# Altium footprint library WR-TBL_Pluggable PCB Header.PcbLib: 719 footprints (part 15 of 45)
Each footprint in its own frame and in the unit in brackets; x right, y up, seen from the top. Pads: shape width x height; smd on the part's side, far side on the other; paste and mask are expansions set on the pad; w line width, h text height; cw(c..) or ccw(c..) is an arc to the next point about the centre after c.
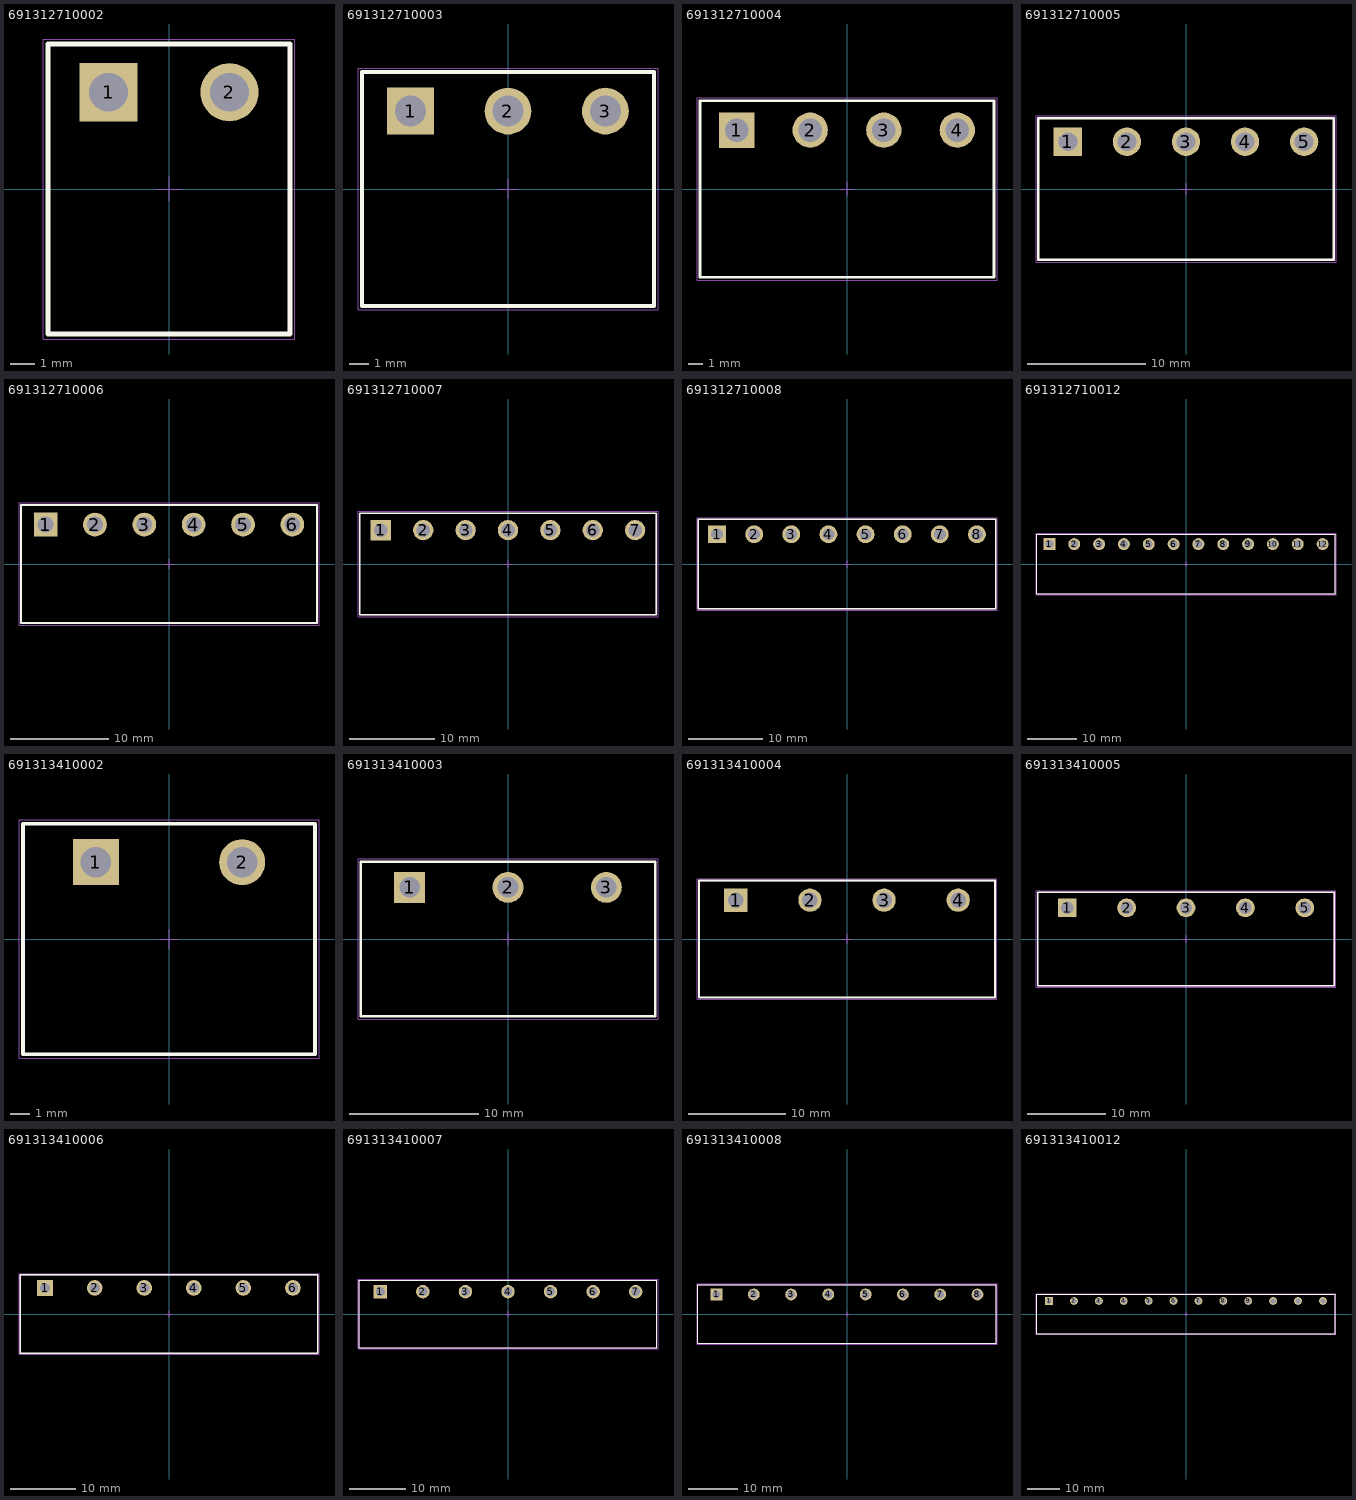
[diagram p14: the footprints below, top view; thin cyan lines are the x and y axes]

## 691312710002 [mm] "5.00mm - Open Horizhontal PCB Header - 02p"
height 8.5
pads (2):
  rect 2.4x2.4 hole 1.6: 1(-2.5,4)
  round 2.4 hole 1.6: 2(2.5,4)
Top Overlay:
  lines w0.2: -5,-6 -5,6 5,6 5,-6 -5,-6
Mechanical 13:
  lines w0.1: -5,-6 5,-6 5,6 -5,6 -5,-6
Mechanical 15:
  lines w0.05: -0.5,0 0.5,0 ; 0,-0.5 0,0.5 ; -5.2,-6.2 -5.2,6.2 5.2,6.2 5.2,-6.2 -5.2,-6.2
3D body "691312710002.stp": height 8.55, standoff -3.45, extent -5,-6 5,6

## 691312710003 [mm] "5.00mm - Open Horizhontal PCB Header - 03p"
height 8.5
pads (3):
  rect 2.4x2.4 hole 1.6: 1(-5,4)
  round 2.4 hole 1.6: 2(0,4) 3(5,4)
Top Overlay:
  lines w0.2: -7.5,-6 7.5,-6 7.5,6 -7.5,6 -7.5,-6
Mechanical 13:
  lines w0.1: -7.5,-6 -7.5,6 7.5,6 7.5,-6 -7.5,-6
Mechanical 15:
  lines w0.05: -0.5,0 0.5,0 ; 0,-0.5 0,0.5 ; -7.7,-6.2 7.7,-6.2 7.7,6.2 -7.7,6.2 -7.7,-6.2
3D body "691312710003.stp": height 8.55, standoff -3.45, extent -7.5,-6 7.5,6

## 691312710004 [mm] "5.00mm - Open Horizhontal PCB Header - 04p"
height 8.5
pads (4):
  rect 2.4x2.4 hole 1.6: 1(-7.5,4)
  round 2.4 hole 1.6: 2(-2.5,4) 3(2.5,4) 4(7.5,4)
Top Overlay:
  lines w0.2: -10,-6 10,-6 10,6 -10,6 -10,-6
Mechanical 13:
  lines w0.1: -10,-6 -10,6 10,6 10,-6 -10,-6
Mechanical 15:
  lines w0.05: -0.5,0 0.5,0 ; 0,-0.5 0,0.5 ; -10.2,-6.2 10.2,-6.2 10.2,6.2 -10.2,6.2 -10.2,-6.2
3D body "691312710004.stp": height 8.55, standoff -3.45, extent -10,-6 10,6

## 691312710005 [mm] "5.00mm - Open Horizhontal PCB Header - 05p"
height 8.5
pads (5):
  rect 2.4x2.4 hole 1.6: 1(-10,4)
  round 2.4 hole 1.6: 2(-5,4) 3(0,4) 4(5,4) 5(10,4)
Top Overlay:
  lines w0.2: -12.5,-6 12.5,-6 12.5,6 -12.5,6 -12.5,-6
Mechanical 13:
  lines w0.1: -12.5,-6 -12.5,6 12.5,6 12.5,-6 -12.5,-6
Mechanical 15:
  lines w0.05: -0.5,0 0.5,0 ; 0,-0.5 0,0.5 ; -12.7,-6.2 12.7,-6.2 12.7,6.2 -12.7,6.2 -12.7,-6.2
3D body "691312710005.stp": height 8.55, standoff -3.45, extent -12.5,-6 12.5,6

## 691312710006 [mm] "5.00mm - Open Horizhontal PCB Header - 06p"
height 8.5
pads (6):
  rect 2.4x2.4 hole 1.6: 1(-12.5,4)
  round 2.4 hole 1.6: 2(-7.5,4) 3(-2.5,4) 4(2.5,4) 5(7.5,4) 6(12.5,4)
Top Overlay:
  lines w0.2: -15,-6 -15,6 15,6 15,-6 -15,-6
Mechanical 13:
  lines w0.1: -15,-6 15,-6 15,6 -15,6 -15,-6
Mechanical 15:
  lines w0.05: -0.5,0 0.5,0 ; 0,-0.5 0,0.5 ; -15.2,-6.2 -15.2,6.2 15.2,6.2 15.2,-6.2 -15.2,-6.2
3D body "691312710006.stp": height 8.55, standoff -3.45, extent -15,-6 15,6

## 691312710007 [mm] "5.00mm - Open Horizhontal PCB Header - 07p"
height 8.5
pads (7):
  rect 2.4x2.4 hole 1.6: 1(-15,4)
  round 2.4 hole 1.6: 2(-10,4) 3(-5,4) 4(0,4) 5(5,4) 6(10,4) 7(15,4)
Top Overlay:
  lines w0.2: -17.5,-6 -17.5,6 17.5,6 17.5,-6 -17.5,-6
Mechanical 13:
  lines w0.1: -17.5,-6 17.5,-6 17.5,6 -17.5,6 -17.5,-6
Mechanical 15:
  lines w0.05: -0.5,0 0.5,0 ; 0,-0.5 0,0.5 ; -17.7,-6.2 -17.7,6.2 17.7,6.2 17.7,-6.2 -17.7,-6.2
3D body "691312710007.stp": height 8.55, standoff -3.45, extent -17.5,-6 17.5,6

## 691312710008 [mm] "5.00mm - Open Horizhontal PCB Header - 08p"
height 8.5
pads (8):
  rect 2.4x2.4 hole 1.6: 1(-17.5,4)
  round 2.4 hole 1.6: 2(-12.5,4) 3(-7.5,4) 4(-2.5,4) 5(2.5,4) 6(7.5,4) 7(12.5,4) 8(17.5,4)
Top Overlay:
  lines w0.2: -20,-6 -20,6 20,6 20,-6 -20,-6
Mechanical 13:
  lines w0.1: -20,-6 20,-6 20,6 -20,6 -20,-6
Mechanical 15:
  lines w0.05: -0.5,0 0.5,0 ; 0,-0.5 0,0.5 ; -20.2,-6.2 -20.2,6.2 20.2,6.2 20.2,-6.2 -20.2,-6.2
3D body "691312710008.stp": height 8.55, standoff -3.45, extent -20,-6 20,6

## 691312710012 [mm] "5.00mm - Open Horizhontal PCB Header - 12p"
height 8.5
pads (12):
  rect 2.4x2.4 hole 1.6: 1(-27.5,4)
  round 2.4 hole 1.6: 2(-22.5,4) 3(-17.5,4) 4(-12.5,4) 5(-7.5,4) 6(-2.5,4) 7(2.5,4) 8(7.5,4) 9(12.5,4) 10(17.5,4) 11(22.5,4) 12(27.5,4)
Top Overlay:
  lines w0.2: -30,-6 30,-6 30,6 -30,6 -30,-6
Mechanical 13:
  lines w0.1: -30,-6 -30,6 30,6 30,-6 -30,-6
Mechanical 15:
  lines w0.05: -0.5,0 0.5,0 ; 0,-0.5 0,0.5 ; -30.2,-6.2 30.2,-6.2 30.2,6.2 -30.2,6.2 -30.2,-6.2
3D body "691312710012.stp": height 8.55, standoff -3.45, extent -30,-6 30,6

## 691313410002 [mm] "7.62 mm - Closed Horizonal PCB Header - 2p"
height 8.5
pads (2):
  rect 2.4x2.4 hole 1.6: 1(-3.81,4)
  round 2.4 hole 1.6: 2(3.81,4)
Top Overlay:
  lines w0.2: -7.61,-6 7.61,-6 7.61,6 -7.61,6 -7.61,-6
Mechanical 13:
  lines w0.1: -7.61,-6 -7.61,6 7.61,6 7.61,-6 -7.61,-6
Mechanical 15:
  lines w0.05: -0.5,0 0.5,0 ; 0,-0.5 0,0.5 ; -7.81,-6.2 7.81,-6.2 7.81,6.2 -7.81,6.2 -7.81,-6.2
3D body "691313410002.stp": height 8.55, standoff -3.95, extent -7.62,-6 7.62,6

## 691313410003 [mm] "7.62 mm - Closed Horizonal PCB Header - 3p"
height 8.5
pads (3):
  rect 2.4x2.4 hole 1.6: 1(-7.62,4)
  round 2.4 hole 1.6: 2(0,4) 3(7.62,4)
Top Overlay:
  lines w0.2: -11.42,-6 -11.42,6 11.42,6 11.42,-6 -11.42,-6
Mechanical 13:
  lines w0.1: -11.42,-6 11.42,-6 11.42,6 -11.42,6 -11.42,-6
Mechanical 15:
  lines w0.05: -0.5,0 0.5,0 ; 0,-0.5 0,0.5 ; -11.62,-6.2 -11.62,6.2 11.62,6.2 11.62,-6.2 -11.62,-6.2
3D body "691313410003.stp": height 8.55, standoff -3.95, extent -11.43,-6 11.43,6

## 691313410004 [mm] "7.62 mm - Closed Horizonal PCB Header - 4p"
height 8.5
pads (4):
  rect 2.4x2.4 hole 1.6: 1(-11.43,4)
  round 2.4 hole 1.6: 2(-3.81,4) 3(3.81,4) 4(11.43,4)
Top Overlay:
  lines w0.2: -15.23,-6 15.23,-6 15.23,6 -15.23,6 -15.23,-6
Mechanical 13:
  lines w0.1: -15.23,-6 -15.23,6 15.23,6 15.23,-6 -15.23,-6
Mechanical 15:
  lines w0.05: -0.5,0 0.5,0 ; 0,-0.5 0,0.5 ; -15.43,-6.2 15.43,-6.2 15.43,6.2 -15.43,6.2 -15.43,-6.2
3D body "691313410004.stp": height 8.55, standoff -3.95, extent -15.24,-6 15.24,6

## 691313410005 [mm] "7.62 mm - Closed Horizonal PCB Header - 5p"
height 8.5
pads (5):
  rect 2.4x2.4 hole 1.6: 1(-15.24,4)
  round 2.4 hole 1.6: 2(-7.62,4) 3(0,4) 4(7.62,4) 5(15.24,4)
Top Overlay:
  lines w0.2: -19.04,-6 19.04,-6 19.04,6 -19.04,6 -19.04,-6
Mechanical 13:
  lines w0.1: -19.04,-6 -19.04,6 19.04,6 19.04,-6 -19.04,-6
Mechanical 15:
  lines w0.05: -0.5,0 0.5,0 ; 0,-0.5 0,0.5 ; -19.24,-6.2 19.24,-6.2 19.24,6.2 -19.24,6.2 -19.24,-6.2
3D body "691313410005.stp": height 8.55, standoff -3.95, extent -19.05,-6 19.05,6

## 691313410006 [mm] "7.62 mm - Closed Horizonal PCB Header - 6p"
height 8.5
pads (6):
  rect 2.4x2.4 hole 1.6: 1(-19.05,4)
  round 2.4 hole 1.6: 2(-11.43,4) 3(-3.81,4) 4(3.81,4) 5(11.43,4) 6(19.05,4)
Top Overlay:
  lines w0.2: -22.85,-6 -22.85,6 22.85,6 22.85,-6 -22.85,-6
Mechanical 13:
  lines w0.1: -22.85,-6 22.85,-6 22.85,6 -22.85,6 -22.85,-6
Mechanical 15:
  lines w0.05: -0.5,0 0.5,0 ; 0,-0.5 0,0.5 ; -23.05,-6.2 -23.05,6.2 23.05,6.2 23.05,-6.2 -23.05,-6.2
3D body "691313410006.stp": height 8.55, standoff -3.95, extent -22.86,-6 22.86,6

## 691313410007 [mm] "7.62 mm - Closed Horizonal PCB Header - 7p"
height 8.5
pads (7):
  rect 2.4x2.4 hole 1.6: 1(-22.86,4)
  round 2.4 hole 1.6: 2(-15.24,4) 3(-7.62,4) 4(0,4) 5(7.62,4) 6(15.24,4) 7(22.86,4)
Top Overlay:
  lines w0.2: -26.66,-6 26.66,-6 26.66,6 -26.66,6 -26.66,-6
Mechanical 13:
  lines w0.1: -26.66,-6 -26.66,6 26.66,6 26.66,-6 -26.66,-6
Mechanical 15:
  lines w0.05: -0.5,0 0.5,0 ; 0,-0.5 0,0.5 ; -26.86,-6.2 26.86,-6.2 26.86,6.2 -26.86,6.2 -26.86,-6.2
3D body "691313410007.stp": height 8.55, standoff -3.95, extent -26.67,-6 26.67,6

## 691313410008 [mm] "7.62 mm - Closed Horizonal PCB Header - 8p"
height 8.5
pads (8):
  rect 2.4x2.4 hole 1.6: 1(-26.67,4)
  round 2.4 hole 1.6: 2(-19.05,4) 3(-11.43,4) 4(-3.81,4) 5(3.81,4) 6(11.43,4) 7(19.05,4) 8(26.67,4)
Top Overlay:
  lines w0.2: -30.47,-6 -30.47,6 30.47,6 30.47,-6 -30.47,-6
Mechanical 13:
  lines w0.1: -30.47,-6 30.47,-6 30.47,6 -30.47,6 -30.47,-6
Mechanical 15:
  lines w0.05: -0.5,0 0.5,0 ; 0,-0.5 0,0.5 ; -30.67,-6.2 -30.67,6.2 30.67,6.2 30.67,-6.2 -30.67,-6.2
3D body "691313410008.stp": height 8.55, standoff -3.95, extent -30.48,-6 30.48,6

## 691313410012 [mm] "7.62 mm - Closed Horizonal PCB Header - 12p"
height 8.5
pads (12):
  rect 2.4x2.4 hole 1.6: 1(-41.91,4)
  round 2.4 hole 1.6: 2(-34.29,4) 3(-26.67,4) 4(-19.05,4) 5(-11.43,4) 6(-3.81,4) 7(3.81,4) 8(11.43,4) 9(19.05,4) 10(26.67,4) 11(34.29,4) 12(41.91,4)
Top Overlay:
  lines w0.2: -45.71,-6 -45.71,6 45.71,6 45.71,-6 -45.71,-6
Mechanical 13:
  lines w0.1: -45.71,-6 45.71,-6 45.71,6 -45.71,6 -45.71,-6
Mechanical 15:
  lines w0.05: -0.5,0 0.5,0 ; 0,-0.5 0,0.5 ; -45.91,-6.2 -45.91,6.2 45.91,6.2 45.91,-6.2 -45.91,-6.2
3D body "691313410012.stp": height 8.55, standoff -3.95, extent -45.72,-6 45.72,6